# Altium integrated library CoLib.IntLib: 649 symbols (part 2 of 5) (continued)
## IMP706SCSA (continued)
POWER MANAGEMENT, Power supply monitor: 2.93V, Debounced manual reset input, 200ms reset(Active LOW) time delay, Guaranteed RESET assertion to VCC = 1.1V,  SO packages; Manufacturer: IMP; Name: 电源管理芯片; Ordering NO.: IMP706SCSA
footprint SO8/1.27_4.9*3.9 (SOIC, 8-Leads, Body 4.9x3.9mm, Pitch 1.27mm,)
pins: 1 ~{MR} (in), 2 Vcc (power), 3 GND (power), 4 PFI (in), 5 ~{PFO} (out), 6 WDI (out), 7 ~{RESET} (out), 8 ~{WDO} (out)

## IMP706SESA
designator U?
POWER MANAGEMENT, Power supply monitor: 2.93V, Debounced manual reset input, 200ms reset(Active LOW) time delay, Guaranteed RESET assertion to VCC = 1.1V,  SO packages; Manufacturer: IMP; Name: 电源管理芯片; Ordering NO.: IMP706SESA
footprint SO8/1.27_4.9*3.9 (SOIC, 8-Leads, Body 4.9x3.9mm, Pitch 1.27mm,)
pins: 1 ~{MR} (in), 2 Vcc (power), 3 GND (power), 4 PFI (in), 5 ~{PFO} (out), 6 WDI (out), 7 ~{RESET} (out), 8 ~{WDO} (out)

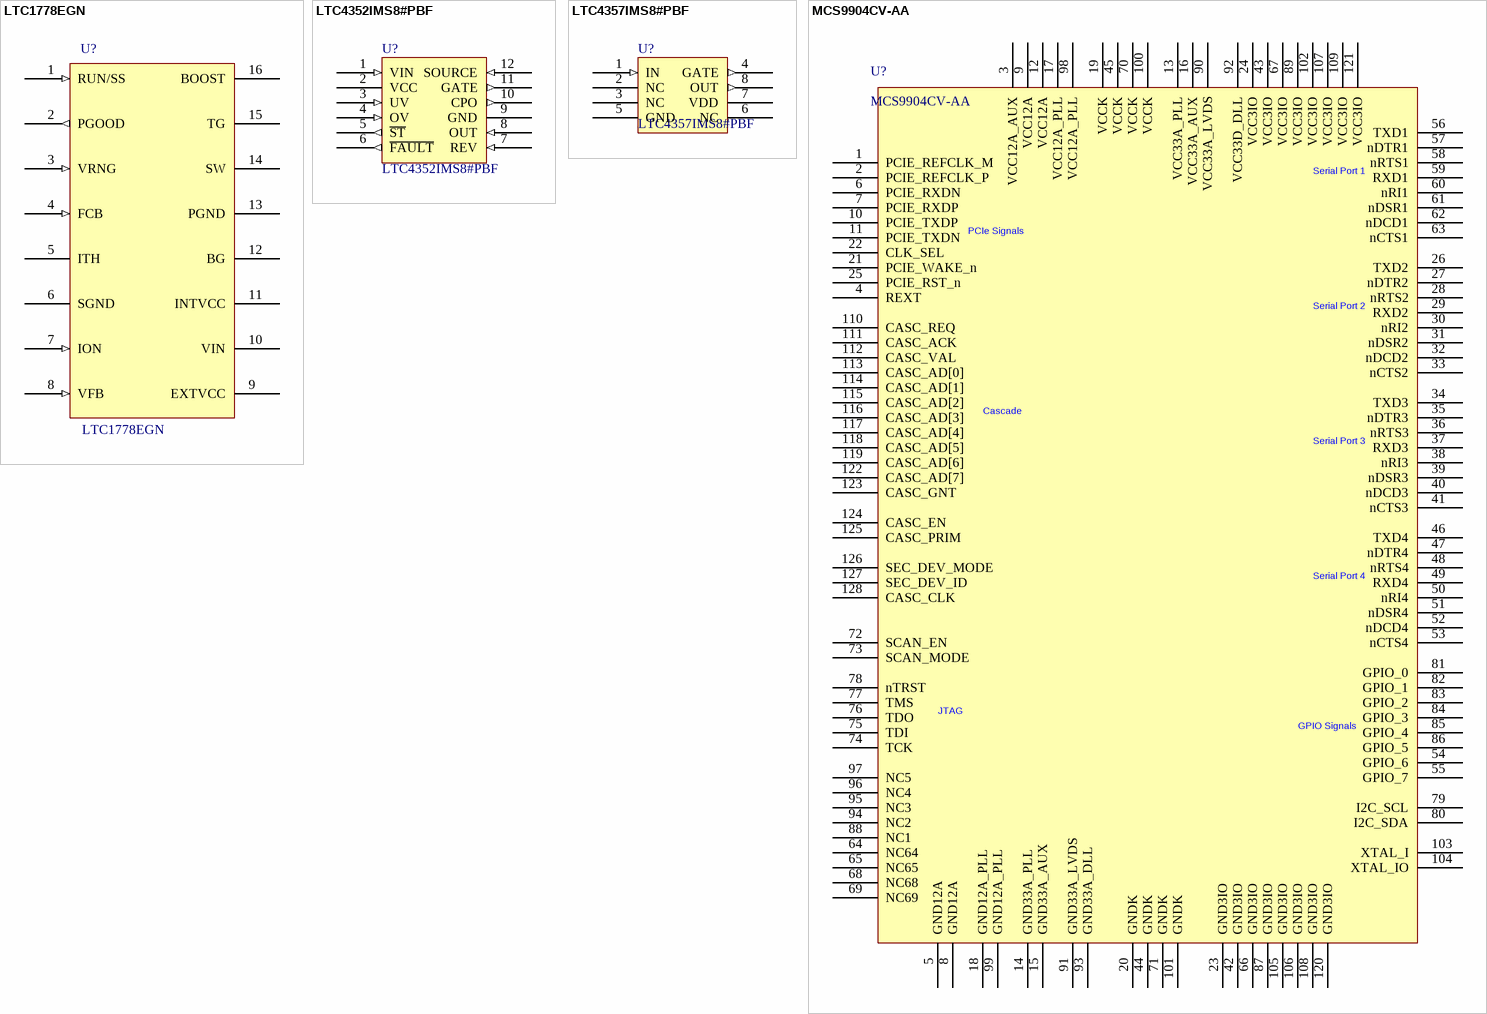
[diagram p13: symbols LTC1778EGN to MCS9904CV-AA]

## LTC1778EGN
designator U?
Wide Operating Range,No R(SENSE),Step-Down Controller; Manufacturer: Linear; Name: 电源管理芯片; Ordering NO.: LTC1778EGN
footprint SSOP16/0.635_4.9*3.9 (SSOP; 16 Leads; Body Width 3.9 mm; Pitch 0.635 mm)
pins: 1 RUN/SS (in), 2 PGOOD (out), 3 VRNG (in), 4 FCB (in), 5 ITH, 6 SGND (power), 7 ION (in), 8 VFB (in), 9 EXTVCC (power), 10 VIN (power), 11 INTVCC (power), 12 BG, 13 PGND (power), 14 SW, 15 TG, 16 BOOST

## LTC4352IMS8#PBF
designator U?
Low Voltage Ideal Diode Controller with Monitoring; Manufacturer: Linear; Name: 电源管理芯片; Ordering NO.: LTC4352IMS8#PBF
footprint MSOP12/0.65_4*3 (MSOP,8 PIN,Pitch 0.65mm,Body 4mmX3mm)
pins: 1 VIN (in), 2 VCC (power), 3 UV (in), 4 OV (in), 5 ~{ST} (out), 6 ~{FAULT} (out), 7 REV (in), 8 OUT (in), 9 GND (power), 10 CPO (out), 11 GATE (out), 12 SOURCE (in)

## LTC4357IMS8#PBF
designator U?
Positive High Voltage Ideal Diode Controller; Manufacturer: Linear; Name: 电源管理芯片; Ordering NO.: LTC4357IMS8#PBF
footprint MSOP8/0.65_3*3 (MSOP,8 PIN,Pitch 0.65mm,Body 3mmX3mm)
pins: 1 IN (in), 2 NC, 3 NC, 4 GATE (out), 5 GND (power), 6 NC, 7 VDD (power), 8 OUT (out)

## MCS9904CV-AA
designator U?
PCI_E 4UART; Price: 20
footprint LQFP128/0.4_14*14 (Shrink QFP, 128-Leads, Body 14x14mm, Pitch 0.4mm, IPC High Density)
pins: 1 PCIE_REFCLK_M, 2 PCIE_REFCLK_P, 3 VCC12A_AUX (power), 4 REXT, 5 GND12A (power), 6 PCIE_RXDN, 7 PCIE_RXDP, 8 GND12A (power), 9 VCC12A (power), 10 PCIE_TXDP, 11 PCIE_TXDN, 12 VCC12A (power), 13 VCC33A_PLL (power), 14 GND33A_PLL (power), 15 GND33A_AUX (power), 16 VCC33A_AUX (power), 17 VCC12A_PLL (power), 18 GND12A_PLL (power), 19 VCCK (power), 20 GNDK (power), 21 PCIE_WAKE_n, 22 CLK_SEL, 23 GND3IO (power), 24 VCC3IO (power), 25 PCIE_RST_n, 26 TXD2, 27 nDTR2, 28 nRTS2, 29 RXD2, 30 nRI2, 31 nDSR2, 32 nDCD2, 33 nCTS2, 34 TXD3, 35 nDTR3, 36 nRTS3, 37 RXD3, 38 nRI3, 39 nDSR3, 40 nDCD3, 41 nCTS3, 42 GND3IO (power), 43 VCC3IO (power), 44 GNDK (power), 45 VCCK (power), 46 TXD4, 47 nDTR4, 48 nRTS4, 49 RXD4, 50 nRI4, 51 nDSR4, 52 nDCD4, 53 nCTS4, 54 GPIO_6, 55 GPIO_7, 56 TXD1, 57 nDTR1, 58 nRTS1, 59 RXD1, 60 nRI1, 61 nDSR1, 62 nDCD1, 63 nCTS1, 64 NC64, 65 NC65, 66 GND3IO (power), 67 VCC3IO (power), 68 NC68, 69 NC69, 70 VCCK (power), 71 GNDK (power), 72 SCAN_EN, 73 SCAN_MODE, 74 TCK, 75 TDI, 76 TDO, 77 TMS, 78 nTRST, 79 I2C_SCL, 80 I2C_SDA, 81 GPIO_0, 82 GPIO_1, 83 GPIO_2, 84 GPIO_3, 85 GPIO_4, 86 GPIO_5, 87 GND3IO (power), 88 NC1, 89 VCC3IO (power), 90 VCC33A_LVDS (power), 91 GND33A_LVDS (power), 92 VCC33D_DLL (power), 93 GND33A_DLL (power), 94 NC2, 95 NC3, 96 NC4, 97 NC5, 98 VCC12A_PLL (power), 99 GND12A_PLL (power), 100 VCCK (power), 101 GNDK (power), 102 VCC3IO (power), 103 XTAL_I, 104 XTAL_IO, 105 GND3IO (power), 106 GND3IO (power), 107 VCC3IO (power), 108 GND3IO (power), 109 VCC3IO (power), 110 CASC_REQ, 111 CASC_ACK, 112 CASC_VAL, 113 CASC_AD[0], 114 CASC_AD[1], 115 CASC_AD[2], 116 CASC_AD[3], 117 CASC_AD[4], 118 CASC_AD[5], 119 CASC_AD[6], 120 GND3IO (power), 121 VCC3IO (power), 122 CASC_AD[7], 123 CASC_GNT, 124 CASC_EN, 125 CASC_PRIM, 126 SEC_DEV_MODE, 127 SEC_DEV_ID, 128 CASC_CLK
text: Serial Port 1; PCIe Signals; Serial Port 2; Cascade; Serial Port 3; Serial Port 4; JTAG; GPIO Signals

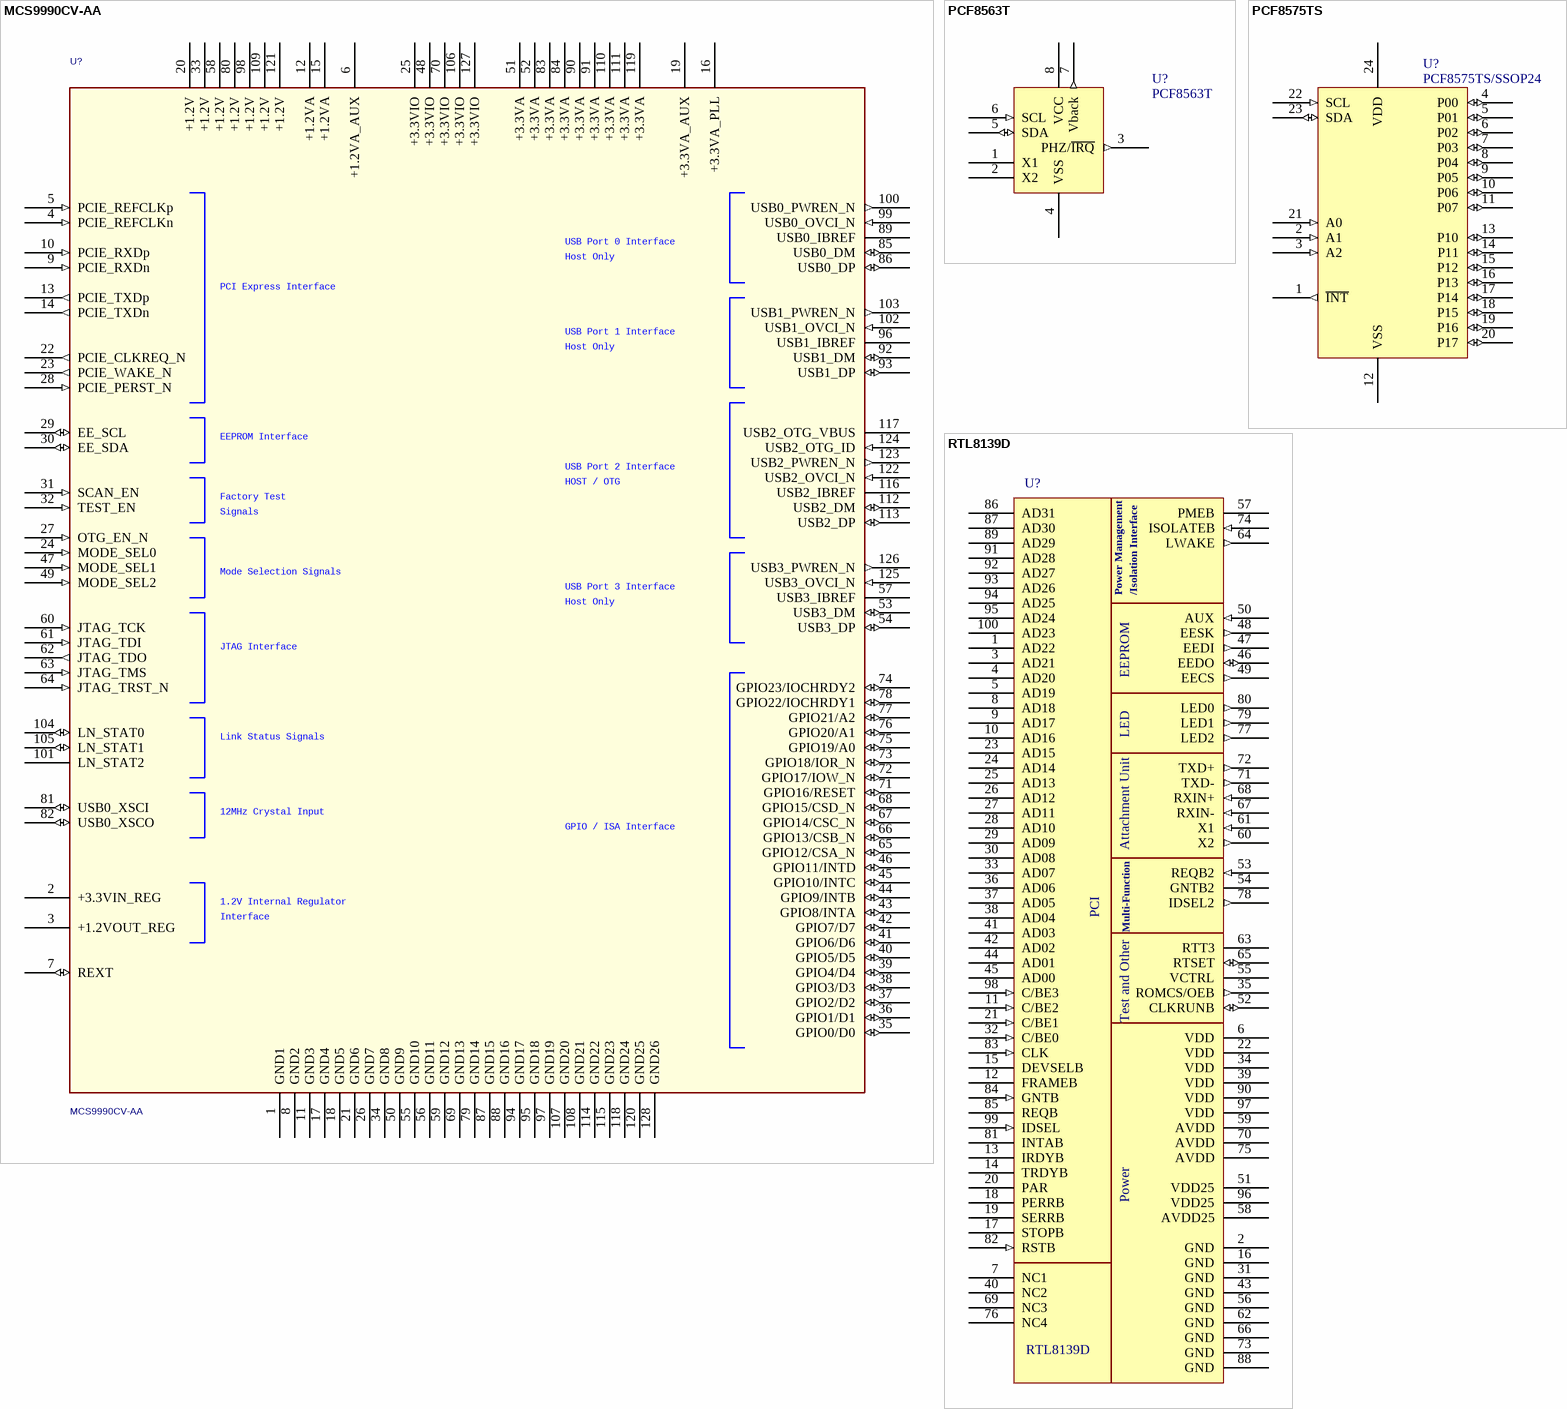
[diagram p14: symbols MCS9990CV-AA to RTL8139D]

## MCS9990CV-AA
designator U?
PCIe至ISA桥,USB2.0主控器; Manufacturer: ASIX; Name: USB2.0 Host x4; 物料替代型号: MCS9990IV-AA工业温度; 物料型号说明: 商业温度; Price: 25; Ordering NO.: MCS9990CV-AA
footprint LQFP128/0.4_14*14 (Shrink QFP, 128-Leads, Body 14x14mm, Pitch 0.4mm, IPC High Density)
pins: 1 GND1 (power), 2 +3.3VIN_REG (power), 3 +1.2VOUT_REG (power), 4 PCIE_REFCLKn (in), 5 PCIE_REFCLKp (in), 6 +1.2VA_AUX (power), 7 REXT (io), 8 GND2 (power), 9 PCIE_RXDn (in), 10 PCIE_RXDp (in), 11 GND3 (power), 12 +1.2VA (power), 13 PCIE_TXDp (out), 14 PCIE_TXDn (out), 15 +1.2VA (power), 16 +3.3VA_PLL (power), 17 GND4 (power), 18 GND5 (power), 19 +3.3VA_AUX (power), 20 +1.2V (power), 21 GND6 (power), 22 PCIE_CLKREQ_N (out), 23 PCIE_WAKE_N (out), 24 MODE_SEL0 (in), 25 +3.3VIO (power), 26 GND7 (power), 27 OTG_EN_N (in), 28 PCIE_PERST_N (in), 29 EE_SCL (io), 30 EE_SDA (io), 31 SCAN_EN (in), 32 TEST_EN (in), 33 +1.2V (power), 34 GND8 (power), 35 GPIO0/D0 (io), 36 GPIO1/D1 (io), 37 GPIO2/D2 (io), 38 GPIO3/D3 (io), 39 GPIO4/D4 (io), 40 GPIO5/D5 (io), 41 GPIO6/D6 (io), 42 GPIO7/D7 (io), 43 GPIO8/INTA (io), 44 GPIO9/INTB (io), 45 GPIO10/INTC (io), 46 GPIO11/INTD (io), 47 MODE_SEL1 (in), 48 +3.3VIO (power), 49 MODE_SEL2 (in), 50 GND9 (power), 51 +3.3VA (power), 52 +3.3VA (power), 53 USB3_DM (io), 54 USB3_DP (io), 55 GND10 (power), 56 GND11 (power), 57 USB3_IBREF (power), 58 +1.2V (power), 59 GND12 (power), 60 JTAG_TCK (in), 61 JTAG_TDI (in), 62 JTAG_TDO (out), 63 JTAG_TMS (in), 64 JTAG_TRST_N (in), 65 GPIO12/CSA_N (io), 66 GPIO13/CSB_N (io), 67 GPIO14/CSC_N (io), 68 GPIO15/CSD_N (io), 69 GND13 (power), 70 +3.3VIO (power), 71 GPIO16/RESET (io), 72 GPIO17/IOW_N (io), 73 GPIO18/IOR_N (io), 74 GPIO23/IOCHRDY2 (io), 75 GPIO19/A0 (io), 76 GPIO20/A1 (io), 77 GPIO21/A2 (io), 78 GPIO22/IOCHRDY1 (io), 79 GND14 (power), 80 +1.2V (power), 81 USB0_XSCI (io), 82 USB0_XSCO (io), 83 +3.3VA (power), 84 +3.3VA (power), 85 USB0_DM (io), 86 USB0_DP (io), 87 GND15 (power), 88 GND16 (power), 89 USB0_IBREF (power), 90 +3.3VA (power), 91 +3.3VA (power), 92 USB1_DM (io), 93 USB1_DP (io), 94 GND17 (power), 95 GND18 (power), 96 USB1_IBREF (power), 97 GND19 (power), 98 +1.2V (power), 99 USB0_OVCI_N (in), 100 USB0_PWREN_N (out), 101 LN_STAT2 (hiz), 102 USB1_OVCI_N (in), 103 USB1_PWREN_N (out), 104 LN_STAT0 (io), 105 LN_STAT1 (io), 106 +3.3VIO (power), 107 GND20 (power), 108 GND21 (power), 109 +1.2V (power), 110 +3.3VA (power), 111 +3.3VA (power), 112 USB2_DM (io), 113 USB2_DP (io), 114 GND22 (power), 115 GND23 (power), 116 USB2_IBREF (power), 117 USB2_OTG_VBUS (power), 118 GND24 (power), 119 +3.3VA (power), 120 GND25 (power), 121 +1.2V (power), 122 USB2_OVCI_N (in), 123 USB2_PWREN_N (out), 124 USB2_OTG_ID (in), 125 USB3_OVCI_N (in), 126 USB3_PWREN_N (out), 127 +3.3VIO (power), 128 GND26 (power)
text: USB Port 0 Interface; Host Only; PCI Express Interface; USB Port 1 Interface; EEPROM Interface; USB Port 2 Interface; HOST / OTG; Factory Test; Signals; Mode Selection Signals; USB Port 3 Interface; JTAG Interface; Link Status Signals; 12MHz Crystal Input; GPIO / ISA Interface; 1.2V Internal Regulator; Interface

## PCF8563T
designator U?
Real-time clock/calendar; Manufacturer: Philips; Name: 实时时钟; Ordering NO.: PCF8563T
footprint SO8/1.27_4.9*3.9 (SOIC, 8-Leads, Body 4.9x3.9mm, Pitch 1.27mm,)
pins: 1 X1, 2 X2, 3 PHZ/~{IRQ} (out), 4 VSS (power), 5 SDA (io), 6 SCL (in), 7 Vback (out), 8 VCC (power)

## PCF8575TS
designator U?, comment PCF8575TS/SSOP24
16bits IO expander with IIC interface; Manufacturer: Philips; Name: IO扩展芯片; Ordering NO.: PCF8575TS
footprint SSOP24/0.65_8.2*5.3 (Footprint not found)
pins: 1 ~{INT} (out), 2 A1 (in), 3 A2 (in), 4 P00 (io), 5 P01 (io), 6 P02 (io), 7 P03 (io), 8 P04 (io), 9 P05 (io), 10 P06 (io), 11 P07 (io), 12 VSS (power), 13 P10 (io), 14 P11 (io), 15 P12 (io), 16 P13 (io), 17 P14 (io), 18 P15 (io), 19 P16 (io), 20 P17 (io), 21 A0 (in), 22 SCL (in), 23 SDA (io), 24 VDD (power)

## RTL8139D
designator U?
Single-chip Multi-function 10/100Mbps Ethernet Controller with Power Management; Manufacturer: Realtek; Name: 以太网控制器; Ordering NO.: RTL8139D
footprint QFP100/0.65_14*20 (QFP, 100-Leads, Body 25.1x19.1mm (max), Pitch 0.65mm, IPC Medium Density)
pins: 1 AD22 (hiz), 2 GND (power), 3 AD21 (hiz), 4 AD20 (hiz), 5 AD19 (hiz), 6 VDD (power), 7 NC1, 8 AD18 (hiz), 9 AD17 (hiz), 10 AD16 (hiz), 11 C/BE2 (in), 12 FRAMEB (hiz), 13 IRDYB (hiz), 14 TRDYB (hiz), 15 DEVSELB (hiz), 16 GND (power), 17 STOPB (hiz), 18 PERRB (hiz), 19 SERRB (oc), 20 PAR (hiz), 21 C/BE1 (in), 22 VDD (power), 23 AD15 (hiz), 24 AD14, 25 AD13, 26 AD12, 27 AD11 (hiz), 28 AD10 (hiz), 29 AD09 (hiz), 30 AD08 (hiz), 31 GND (power), 32 C/BE0 (in), 33 AD07 (hiz), 34 VDD (power), 35 ROMCS/OEB (out), 36 AD06 (hiz), 37 AD05 (hiz), 38 AD04 (hiz), 39 VDD (power), 40 NC2, 41 AD03 (hiz), 42 AD02 (hiz), 43 GND (power), 44 AD01 (hiz), 45 AD00 (hiz), 46 EEDO (io), 47 EEDI (out), 48 EESK (out), 49 EECS (out), 50 AUX (in), 51 VDD25 (power), 52 CLKRUNB (io), 53 REQB2 (in), 54 GNTB2 (hiz), 55 VCTRL, 56 GND (power), 57 PMEB (oc), 58 AVDD25 (power), 59 AVDD (power), 60 X2 (out), 61 X1 (in), 62 GND (power), 63 RTT3, 64 LWAKE (out), 65 RTSET (io), 66 GND (power), 67 RXIN- (in), 68 RXIN+ (in), 69 NC3, 70 AVDD (power), 71 TXD- (out), 72 TXD+ (out), 73 GND (power), 74 ISOLATEB (in), 75 AVDD (power), 76 NC4, 77 LED2 (out), 78 IDSEL2 (out), 79 LED1 (out), 80 LED0 (out), 81 INTAB (oc), 82 RSTB (in), 83 CLK (in), 84 GNTB (in), 85 REQB (hiz), 86 AD31, 87 AD30, 88 GND (power), 89 AD29, 90 VDD (power), 91 AD28, 92 AD27, 93 AD26, 94 AD25, 95 AD24, 96 VDD25 (power), 97 VDD (power), 98 C/BE3 (in), 99 IDSEL (in), 100 AD23
text: Power Management; /Isolation Interface; EEPROM; LED; Attachment Unit; PCI; Multi-Function; Test and Other; Power

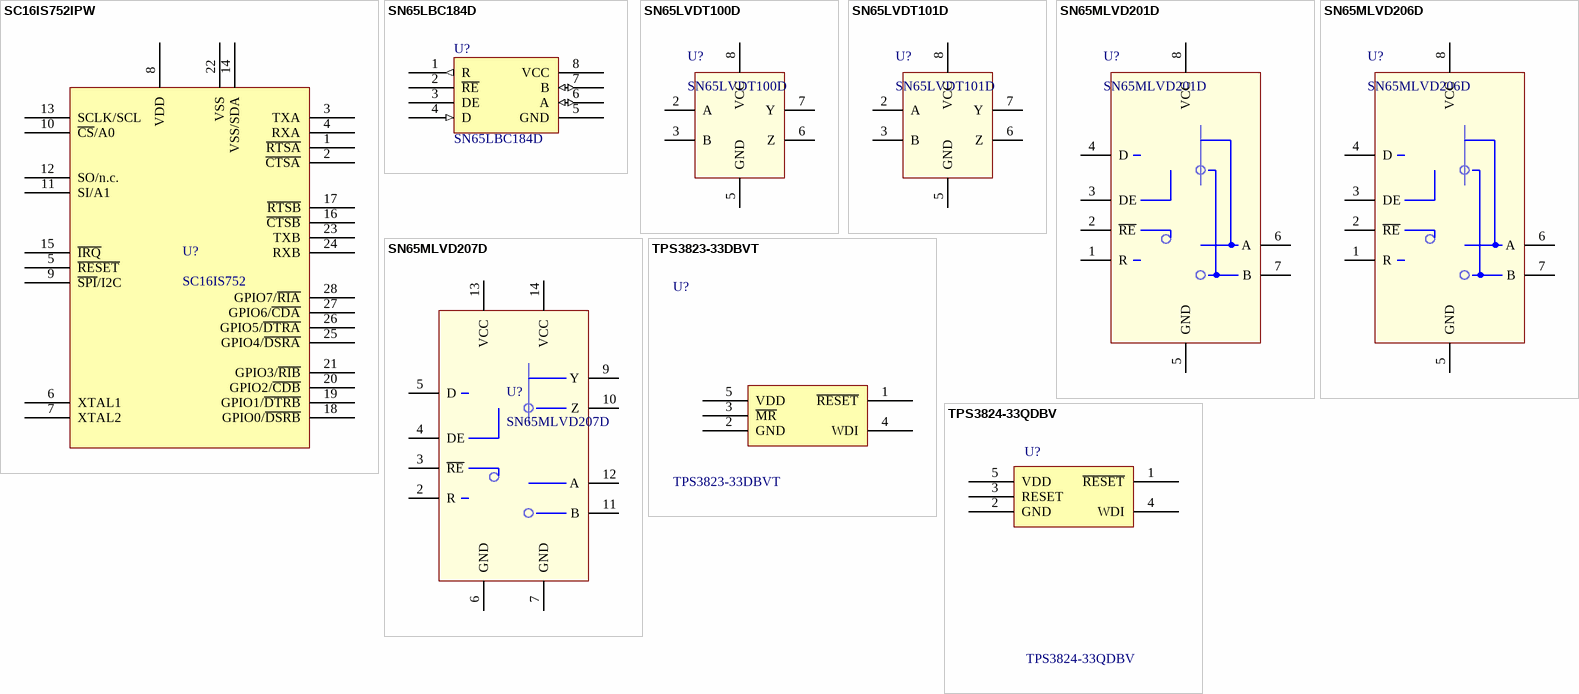
[diagram p15: symbols SC16IS752IPW to TPS3824-33QDBV]

## SC16IS752IPW
designator U?, comment SC16IS752
Dual UART with I2C-bus/SPI interface, 64 bytes of transmit  and receive FIFOs, IrDA SIR built-in support; Manufacturer: NXP; Name: 双通道UART; Ordering NO.: SC16IS752IPW
footprint TSSOP28/0.65_9.7*4.4 (Footprint not found)
pins: 1 ~{RTSA}, 2 ~{CTSA}, 3 TXA, 4 RXA, 5 ~{RESET}, 6 XTAL1, 7 XTAL2, 8 VDD, 9 ~{SPI}/I2C, 10 ~{CS}/A0, 11 SI/A1, 12 SO/n.c., 13 SCLK/SCL, 14 VSS/SDA, 15 ~{IRQ}, 16 ~{CTSB}, 17 ~{RTSB}, 18 GPIO0/~{DSRB}, 19 GPIO1/~{DTRB}, 20 GPIO2/~{CDB}, 21 GPIO3/~{RIB}, 22 VSS, 23 TXB, 24 RXB, 25 GPIO4/~{DSRA}, 26 GPIO5/~{DTRA}, 27 GPIO6/~{CDA}, 28 GPIO7/~{RIA}

## SN65LBC184D
designator U?
Differential Transceiver with Transient Voltage Suppression; Manufacturer: TI; Name: RS485收发器; Ordering NO.: SN65LBC184D
footprint SO8/1.27_4.9*3.9 (SOIC, 8-Leads, Body 4.9x3.9mm, Pitch 1.27mm,)
pins: 1 R (out), 2 ~{RE} (power), 3 DE, 4 D (in), 5 GND (power), 6 A (io), 7 B (io), 8 VCC (power)

## SN65LVDT100D
designator U?
Differential Translator/Repeater; Manufacturer: TI; Name: 中继器; Ordering NO.: SN65LVDT100D
footprint SO8/1.27_4.9*3.9 (SOIC, 8-Leads, Body 4.9x3.9mm, Pitch 1.27mm,)
pins: 2 A, 3 B, 5 GND, 6 Z, 7 Y, 8 VCC

## SN65LVDT101D
designator U?
Differential Translator/Repeater; Manufacturer: TI; Name: 中继器; Ordering NO.: SN65LVDT101D
footprint SO8/1.27_4.9*3.9 (SOIC, 8-Leads, Body 4.9x3.9mm, Pitch 1.27mm,)
pins: 2 A, 3 B, 5 GND, 6 Z, 7 Y, 8 VCC

## SN65MLVD201D
designator U?
MULTIPOINT-LVDS LINE DRIVER AND RECEIVER; Manufacturer: TI; Name: M-LVDS芯片; Ordering NO.: SN65MLVD201D
footprint SO8/1.27_4.9*3.9 (SOIC, 8-Leads, Body 4.9x3.9mm, Pitch 1.27mm,)
pins: 1 R, 2 ~{RE}, 3 DE, 4 D, 5 GND, 6 A, 7 B, 8 VCC

## SN65MLVD206D
designator U?
MULTIPOINT-LVDS LINE DRIVER AND RECEIVER; Manufacturer: TI; Name: M-LVDS芯片; Ordering NO.: SN65MLVD206D
footprint SO8/1.27_4.9*3.9 (SOIC, 8-Leads, Body 4.9x3.9mm, Pitch 1.27mm,)
pins: 1 R, 2 ~{RE}, 3 DE, 4 D, 5 GND, 6 A, 7 B, 8 VCC

## SN65MLVD207D
designator U?
MULTIPOINT-LVDS LINE DRIVER AND RECEIVER; Manufacturer: TI; Name: M-LVDS芯片; Ordering NO.: SN65MLVD207D
footprint SO14/1.27_8.65*3.9 (SOIC, 14-Leads, Body 8.7x3.9mm, Pitch 1.27mm, IPC Medium Density)
pins: 2 R, 3 ~{RE}, 4 DE, 5 D, 6 GND, 7 GND, 9 Y, 10 Z, 11 B, 12 A, 13 VCC, 14 VCC

## TPS3823-33DBVT
designator U?
Reset+看门狗, Threshold Voltage:2.93V; Manufacturer: TI; Name: 看门狗芯片; Ordering NO.: TPS3823-33DBVT
footprint SOT23-5
pins: 1 ~{RESET}, 2 GND, 3 ~{MR}, 4 WDI, 5 VDD

## TPS3824-33QDBV
designator U?
Processor Supervisory Circuits; Manufacturer: TI; Name: 看门狗芯片; Ordering NO.: TPS3824-33QDBV
footprint SOT23-5 (SOT-23/SC-74A; 5 Leads; Body 3 x 3 mm, inc. leads (LxW max))
pins: 1 ~{RESET}, 2 GND (power), 3 RESET, 4 WDI, 5 VDD (power)


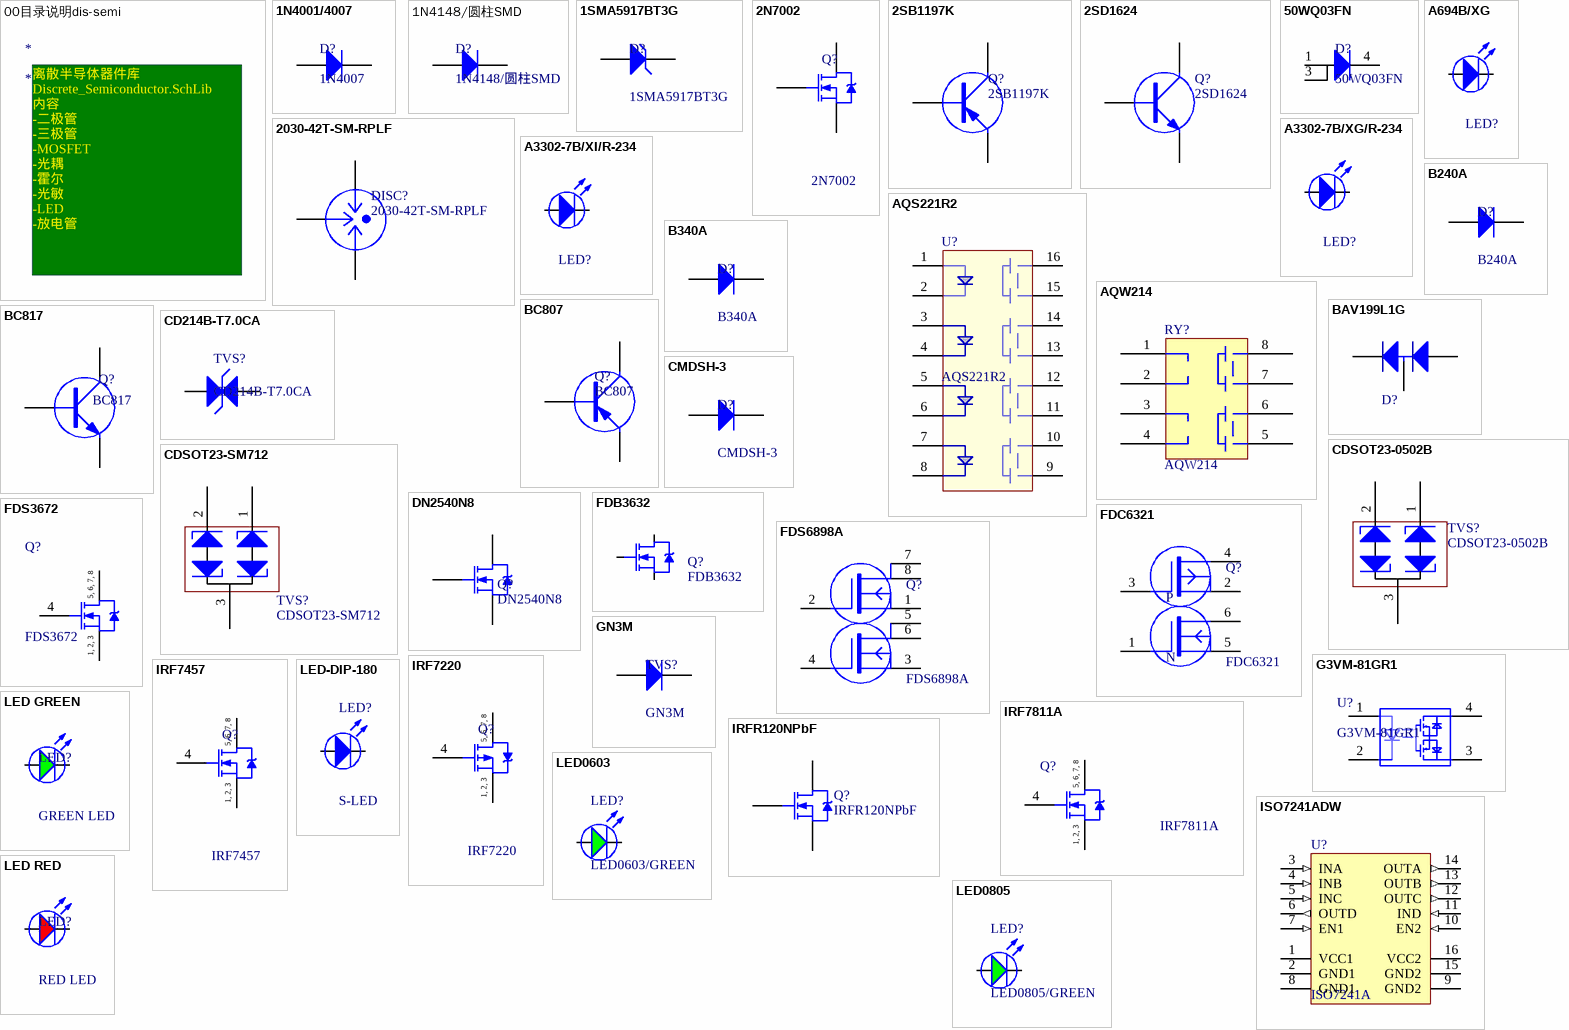
[diagram p16: symbols 00目录说明dis-semi to LED-DIP-180]

## 00目录说明dis-semi
designator *
text: 离散半导体器件库 Discrete_Semiconductor.SchLib / 内容 / -二极管 / -三极管 / -MOSFET / -光耦 / -霍尔 / -光敏 / -LED / -放电管 /

## 1N4001/4007
designator D?, comment 1N4007
已经使用S1MB-13-F代替
footprint D2110 (SMA,D0-214AC,Body 5.3*2.6mm)
pins: 1 A, 2 K

## 1N4148/圆柱SMD
designator D?
1N4148/圆柱SMD表贴二极管,通用; Manufacturer: ON; Name: 二极管; Ordering NO.: 1N4148/无引脚圆柱; Price: 0.09; 物料替代型号: n/a; 物料型号说明: 1N4148/圆柱SMD表贴二极管,通用
footprint D0805 (0805二极管,80x50 mil)
pins: 1 A, 2 K

## 1SMA5917BT3G
designator D?
1.5 Watt Plastic  Surface Mount  4.7V Zener Voltage Regulators; Manufacturer: ON; Name: 二极管; Ordering NO.: 1SMA5917BT3G
footprint D2010 (SMA)
pins: 1 ANODE, 2 CATHODE

## 2N7002
designator Q?
N-channel vertical D-MOS  transistor; Manufacturer: 通用; Name: MOSFET; Price: 0.10; Ordering NO.: 2N7002
footprint SOT23-3 (SOT23, 3-Leads, Body 2.92x1.3mm, Pitch 0.95mm, Lead Span 2.3mm, IPC Medium Density)
pins: 1 G, 2 S, 3 D

## 2SB1197K
designator Q?
Low Frequency Transistor(-32V,-0.8A); Manufacturer: ON; Name: 三极管; Ordering NO.: 2SB1197K
footprint SOT23-3 (SOT23, 3-Leads, Body 2.92x1.3mm, Pitch 0.95mm, Lead Span 2.3mm, IPC Medium Density)
pins: 1 B, 2 E, 3 C

## 2SD1624
designator Q?
Bipolar Transistor 50V, 3A, Low VCE, NPN Single PCP; Manufacturer: ON; Name: 三极管; Ordering NO.: 2SD1624
footprint SOT89-3
pins: 1 B, 2 C, 3 E

## 50WQ03FN
designator D?
Schottky Rectifier, 5.5 A; Manufacturer: ON; Name: 二极管; Ordering NO.: 50WQ03FN
footprint TO-252AA
pins: 1 A, 3 A, 4 K

## 2030-42T-SM-RPLF
designator DISC?
Fast Acting 3-electrode miniature gas discharge tube; Manufacturer: Bourns; Name: 气体放电管; Ordering NO.: 2030-42T-SM-RPLF
footprint GDT3/5*7.3 (GDT,5*7.3mm,3pin)
pins: 1, 2 GND (power), 3

## A694B/XG
designator LED?, comment A694B/XG(单绿)（左负右正）  (value not drawn)
单排直插绿灯; Manufacturer: 都城亿光; Name: LED; Ordering NO.: A694B/XG(单绿)（左负右正）
footprint D-LED2
pins: 1 A, 2 K

## A3302-7B/XG/R-234
designator LED?, comment 单排直插绿灯  (value not drawn)
单排直插绿灯, Forward Current:30mA, Power Dissipation:100mW; Manufacturer: 都城亿光; Name: LED; Ordering NO.: A3302-7B/XG/R-234
footprint D-LED2 (Footprint not found)
pins: 1 A, 2 K

## A3302-7B/XI/R-234
designator LED?, comment 单排直插红灯  (value not drawn)
单排直插红灯, Forward Current:30mA, Power Dissipation:100mW; Manufacturer: 都城亿光; Name: LED; Ordering NO.: A3302-7B/XI/R-234
footprint D-LED2-Red
pins: 1 A, 2 K

## AQS221R2
designator U?
PhotoMOS RELAYS,负载电压:40 V,导通电阻(最大):1.25Ω; Manufacturer: Panasonic; Name: 光耦继电器; Ordering NO.: AQS221R2
footprint SO16/1.27_10.3*4.4 (SOIC, 16-Leads, Body 10.3X4.4mm, Pitch 1.27mm)
pins: 1, 2, 3, 4, 5, 6, 7, 8, 9, 10, 11, 12, 13, 14, 15, 16

## AQW214
designator RY?
PhotoMOS RELAYS,Load voltage:400 V,Load current:100 mA; Manufacturer: Panasonic; Name: 光耦继电器; Ordering NO.: AQW214K/AQW214S
footprint SRLY8/2.54 (Footprint not found)
pins: 1, 2, 3, 4, 5, 6, 7, 8

## B240A
designator D?
High-Current Density Surface Mount Schottky Rectifier,Reverse Voltage 30 & 40 V ,Forward Current 2.0 A; Manufacturer: VISHAY; Name: 二极管; Ordering NO.: B240A
footprint D2010 (SMA,DO-214AC)
pins: 1 A, 2 K

## B340A
designator D?
High-Current Density Surface Mount Schottky Rectifier; Manufacturer: ON; Name: 二极管; Ordering NO.: B340A
footprint D2010
pins: 1 A, 2 K

## BAV199L1G
designator D?  (value not drawn)
Dual Series Switching  Diode; Manufacturer: ON; Name: 二极管; Ordering NO.: BAV199L1G
footprint SOT23-3 (Footprint not found)
pins: 1 A1, 2 A2, 3 A3

## BC807
designator Q?
PNP, 0.8A, 40V; Manufacturer: ON; Name: 三极管; Ordering NO.: BC807
footprint SOT23-3 (SOT23, 3-Leads, Body 2.92x1.3mm, Pitch 0.95mm, Lead Span 2.3mm, IPC Medium Density)
pins: 1 B, 2 E, 3 C

## BC817
designator Q?
NPN, 1.2A, 40V; Manufacturer: ON; Name: 三极管; Price: 0.5; Ordering NO.: BC817
footprint SOT23-3 (SOT23, 3-Leads, Body 2.92x1.3mm, Pitch 0.95mm, Lead Span 2.3mm, IPC Medium Density)
pins: 1 B, 2 E, 3 C

## CD214B-T7.0CA
designator TVS?
双向TVS,600W Surface Mount Transient voltage suppressor with working peak reverse voltage :7.0V; Manufacturer: Bourns; Name: TVS管; Ordering NO.: CD214B-T7.0CA
footprint D2114 (SMB,DO-214AB,2-Leads, Body 5.3x3.6mm)
pins: 1, 2

## CDSOT23-0502B
designator TVS?
The CDSOT23-0502B bidirectional device provides ESD, EFT and Surge protection  for high speed data ports meeting IEC 61000-4-2 (ESD), IEC 61000-4-4 (EFT) and IEC  61000-4-5 (Surge) requirements.; Manufacturer: Bourns; Name: 7.5V双通道双向TVS; Ordering NO.: CDSOT23-0502B
footprint SOT23-3 (SOT23, 3-Leads, Body 2.92x1.3mm, Pitch 0.95mm, Lead Span 2.3mm, IPC Medium Density)
pins: 1, 2, 3

## CDSOT23-SM712
designator TVS?
TVS:2x双向TVS, 7~12V, RS485; Manufacturer: Bourns; Name: TVS管; 物料型号说明: SOT-23封装; tips: 用于RS485防护; Price: 1; 物料替代型号: n/a; Ordering NO.: CDSOT23-SM712
footprint SOT23-3 (SOT23, 3-Leads, Body 2.92x1.3mm, Pitch 0.95mm, Lead Span 2.3mm, IPC Medium Density)
pins: 1, 2, 3

## CMDSH-3
designator D?
SUPER-MINI  SCHOTTKY DIODE, ESD; Manufacturer: ON; Name: 二极管; Ordering NO.: CMDSH-3
footprint SOD-323 (Footprint not found)
pins: 1 A, 2 K

## DN2540N8
designator Q?
N-Channel Depletion-Mode Vertical DMOSFETs; Manufacturer: Supertex inc.; Name: MOSFET; Ordering NO.: DN2540N8
footprint SOT89-3 (SOT89(TO-243AA*), 3-Leads, Body 4.5x2.5mm (max), Pitch 1.60mm, Lead Span 4.1mm, IPC Medium Density)
pins: 1 G, 2 D, 3 S

## FDB3632
designator Q?
N-Channel PowerTrench MOSFET  100V, 80A, 9Ω; Manufacturer: FAIRCHILD; Name: MOSFET; Ordering NO.: FDB3632
footprint TO-263AB-3 (FDB3632)
pins: 1 G, 2 D, 3 S

## FDC6321
designator Q?
双N和P沟道MOSFET,N-Ch 25 V, 0.68 A, RDS(ON) = 0.45 Ω @ VGS= 4.5 V, P-Ch -25 V, -0.46 A, RDS(ON) = 1.1 Ω @ VGS= -4.5 V; Manufacturer: FAIRCHILD; Name: 双MOSFET; Ordering NO.: FDC6321
footprint SOT23-6 (SOT-23/SC-74A; 5 Leads; Body 3.1 x 3 mm, inc. leads (LxW max))
pins: 1 G1, 2 S2, 3 G2, 4 D2, 5 S1, 6 D1
text: P; N

## FDS3672
designator Q?
N-Channel PowerTrench MOSFET  100V, 7.5A, 22mΩ; Manufacturer: FAIRCHILD; Name: MOSFET; Ordering NO.: FDS3672
footprint SO8/1.27_4.9*3.9 (SOIC, 8-Leads, Body 4.9x3.9mm, Pitch 1.27mm,)
pins: 1 S, 2 S, 3 S, 4 G, 5 D, 6 D, 7 D, 8 D
text: 5, 6, 7, 8; 1, 2, 3

## FDS6898A
designator Q?
双N沟道MOSFET,SO8,14moOM,9.4A,20V; Manufacturer: FAIRCHILD; Name: 双MOSFET; Ordering NO.: FDS6898A
footprint SO8/1.27_4.9*3.9 (SOIC, 8-Leads, Body 4.9x3.9mm, Pitch 1.27mm,)
pins: 1 S, 2 G1, 3 S, 4 G2, 5 D, 6 U, 7 D1, 8 D2